# Altium footprint library General.PCBLIB: 231 footprints (part 1 of 15)
Each footprint in its own frame and in the unit in brackets; x right, y up, seen from the top. Pads: shape width x height; smd on the part's side, far side on the other; paste and mask are expansions set on the pad; w line width, h text height; cw(c..) or ccw(c..) is an arc to the next point about the centre after c.
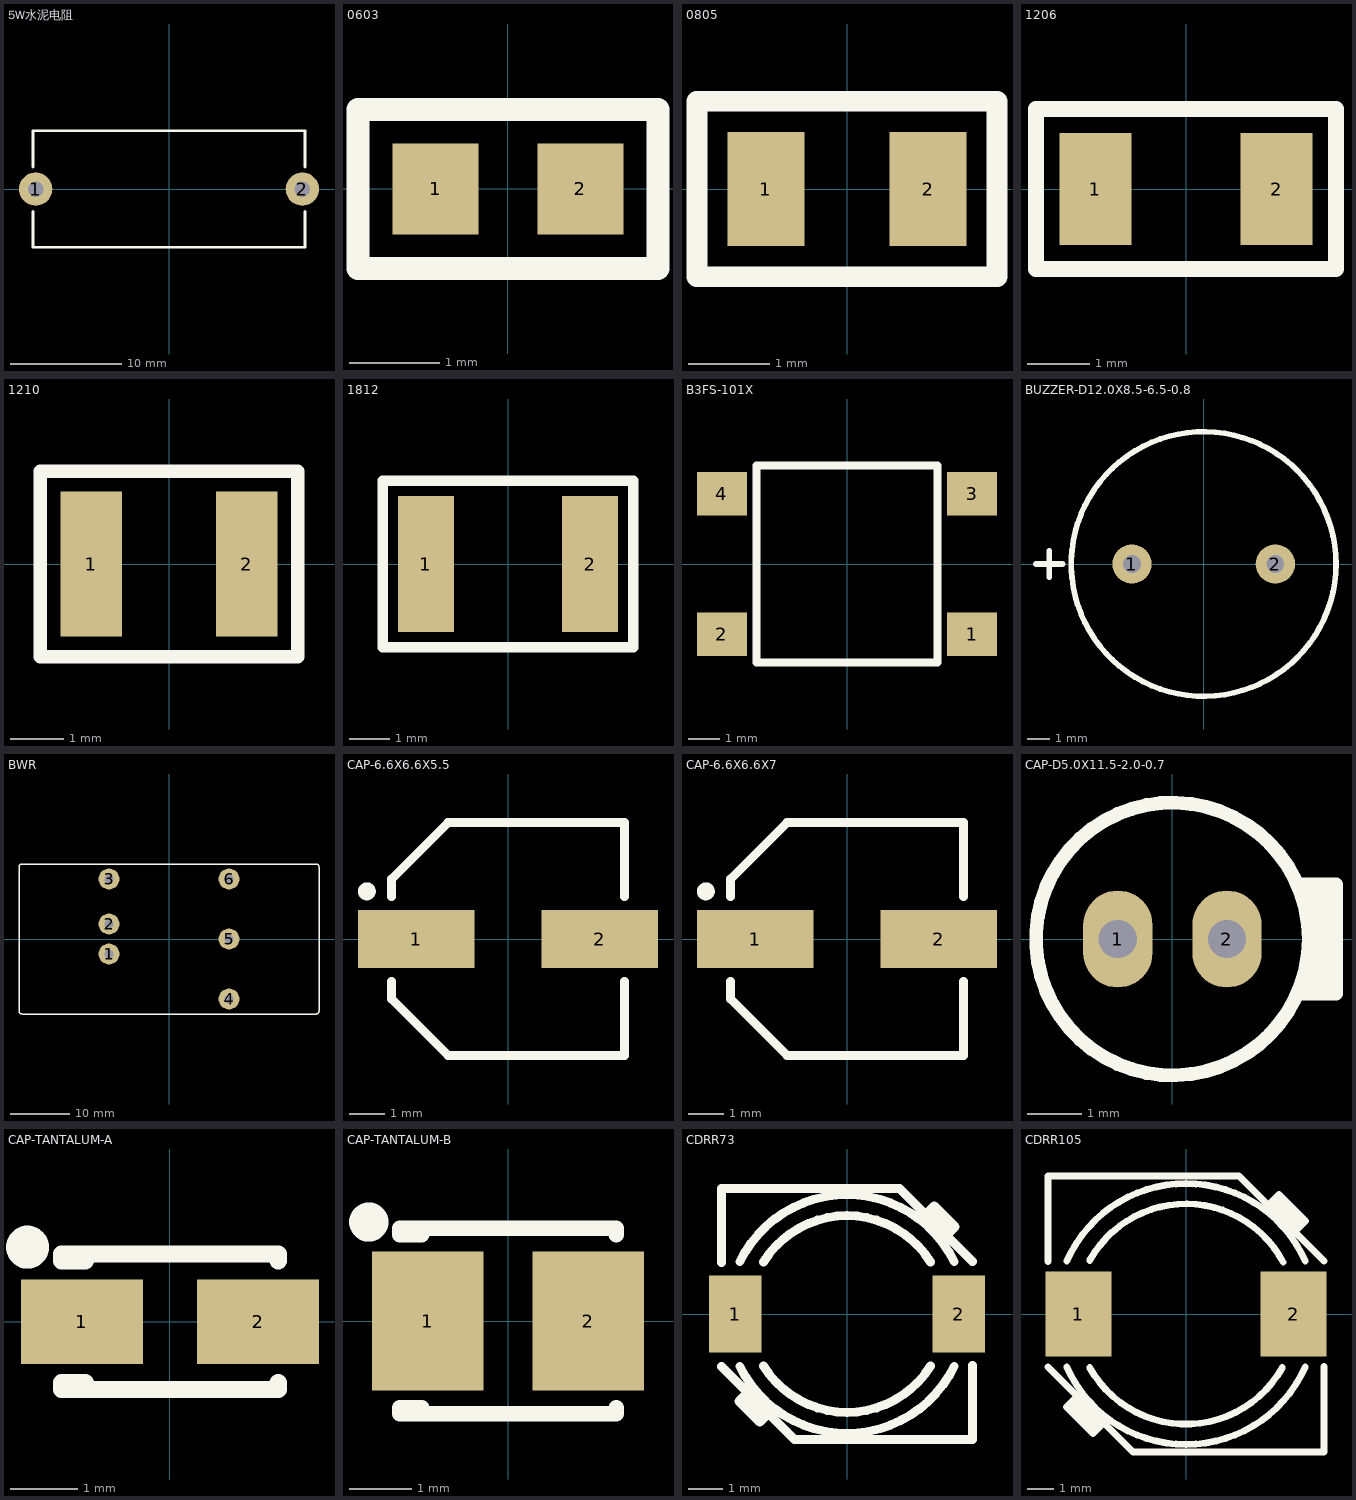
[diagram p0: the footprints below, top view; thin cyan lines are the x and y axes]

## 5W水泥电阻 [mm] "Fuse holder, 5*20mm fuse"
height 12.5
pads (2):
  round 3 hole 1.4: 1(-12,0) 2(12,0)
Top Overlay:
  lines w0.254: -12.25,-2 -12.25,-5.232 12.25,-5.232 12.25,-2 ; -12.25,2 -12.25,5.258 12.25,5.258 12.25,2
3D body "FUSE_HOLDER-MF563.STEP": height 12.5, standoff -2.81, extent -12.25,-4.75 12.25,4.75

## 0603 [mm] "SMD, 0603"
height 0.45
pads (2):
  rect 0.95x1 smd: 1(-0.8,0) 2(0.8,0)
Top Overlay:
  lines w0.254: -1.656,-0.88 -1.656,0.88 1.656,0.88 1.656,-0.88 -1.656,-0.88
3D body "RES0603.STEP": height 0.45, standoff 0, extent -0.775,-0.425 0.775,0.425

## 0805 [mm] "SMD, 0805"
height 0.55
pads (2):
  rect 0.95x1.4 smd: 1(-1,0) 2(1,0)
Top Overlay:
  lines w0.254: -1.85,-1.08 1.85,-1.08 1.85,1.08 -1.85,1.08 -1.85,-1.08
3D body "RESC0805.STEP": height 0.45, standoff 0, extent -1,-0.62 1,0.63

## 1206 [mm] "SMD, 1206"
height 0.55
pads (2):
  rect 1.15x1.8 smd: 1(-1.45,0) 2(1.45,0)
Top Overlay:
  lines w0.254: -2.4,-1.28 -2.4,1.28 2.4,1.28 2.4,-1.28 -2.4,-1.28
3D body "RES1206.STEP": height 0.55, standoff 0, extent -1.6,-0.8 1.6,0.8

## 1210 [mm] "SMD, 1210"
height 0.55
pads (2):
  rect 1.15x2.7 smd: 1(-1.45,0) 2(1.45,0)
Top Overlay:
  lines w0.254: -2.4,-1.73 2.4,-1.73 2.4,1.73 -2.4,1.73 -2.4,-1.73
3D body "RES1210.STEP": height 0.55, standoff 0, extent -1.6,-1.25 1.6,1.25

## 1812 [mm] "SMD, 1812"
height 1.6
pads (2):
  rect 1.4x3.4 smd: 1(-2.05,0) 2(2.05,0)
Top Overlay:
  lines w0.254: -3.13,-2.08 -3.13,2.08 3.13,2.08 3.13,-2.08 -3.13,-2.08
3D body "RES1812.STEP": height 1.6, standoff 0, extent -2.25,-1.6 2.25,1.6

## B3FS-101X [mm] "OMRON TACT-SWITCH"
height 4.3
pads (4):
  rect 1.6x1.4 smd: 1(4,-2.25) 2(-4,-2.25) 3(4,2.25) 4(-4,2.25)
Top Overlay:
  lines w0.254: -2.9,-3.15 -2.9,3.15 2.9,3.15 2.9,-3.15 -2.9,-3.15
3D body "B3FS-1012.stp": height 4.3, standoff 0, extent -4,-3.15 4,3.15

## BUZZER-D12.0X8.5-6.5-0.8 [mm] "Buzzer"
height 8.5
pads (2):
  round 1.778 hole 0.8: 1(-3.25,0) 2(3.25,0)
Top Overlay:
  circle w0.254: c0,0 r6
  lines w0.254: -7.6,0 -6.4,0 ; -7,-0.6 -7,0.6
3D body "BUZZER-12x8.5-6.5.step": height 8.6, standoff -5.4, extent -6,-6 6,6

## BWR [mil] "MURATA POWER"
height 480
pads (6):
  round 140 hole 59.06: 1(-400,-100) 2(-400,100) 3(-400,400) 4(400,-400) 5(400,0) 6(400,400)
Top Overlay:
  lines w10: -1000,-480 ccw(c-980,-480) -980,-500 980,-500 ccw(c980,-480) 1000,-480 1000,480 ccw(c980,480) 980,500 -980,500 ccw(c-980,480) -1000,480 -1000,-480
3D body: height 480, standoff 0, extent -1000,-500 1000,500

## CAP-6.6X6.6X5.5 [mm] "Polar Capacitors, SMD"
height 5.5
pads (2):
  rect 3.3x1.65 smd: 1(-2.6,0) 2(2.6,0)
Top Overlay:
  circle w0.254: c-4,1.35 r0.127
  lines w0.254: -3.3,-1.2 -3.3,-1.7 -1.7,-3.3 3.3,-3.3 3.3,-1.2 ; -3.3,1.2 -3.3,1.7 -1.7,3.3 3.3,3.3 3.3,1.2
3D body "CAP-6.6X6.6X5.5.STEP": height 5.4, standoff 0, extent -3.5,-3.3 3.5,3.3

## CAP-6.6X6.6X7 [mm] "Polar Capacitors, SMD"
height 7
pads (2):
  rect 3.3x1.65 smd: 1(-2.6,0) 2(2.6,0)
Top Overlay:
  circle w0.254: c-4,1.35 r0.127
  lines w0.254: -3.3,-1.2 -3.3,-1.7 -1.7,-3.3 3.3,-3.3 3.3,-1.2 ; -3.3,1.2 -3.3,1.7 -1.7,3.3 3.3,3.3 3.3,1.2
3D body "CAP-6.6X6.6X7.STEP": height 7.7, standoff 0, extent -3.5,-3.3 3.5,3.3

## CAP-D5.0X11.5-2.0-0.7 [mm] "Polar Capacitors"
height 11.5
pads (2):
  oval 1.27x1.778 hole 0.7: 1(-1,0) 2(1,0)
Top Overlay:
  circle w0.254: c0,0 r2.5
  lines w0.254: 2.291,-1 3,-1 3,1 2.291,1 ; 2.6,-1 2.6,1 ; 2.8,-1 2.8,1
3D body "CAPPR200-500X1150.step": height 11.51, standoff -2.7, extent -2.5,-2.5 2.488,2.5

## CAP-TANTALUM-A [mm] "Tantalum Capacitor Case A, SMD"
height 1.8
pads (2):
  rect 1.8x1.25 smd: 1(-1.3,0) 2(1.3,0)
Top Overlay:
  circle w0.381: c-2.1,1.1 r0.127
  lines w0.254: -1.45,-1 -1.45,-0.9 ; -1.45,0.9 -1.45,1 ; -1.25,-1 -1.25,-0.9 -1.6,-0.9 -1.6,-1 1.6,-1 1.6,-0.9 ; -1.25,1 -1.25,0.9 -1.6,0.9 -1.6,1 1.6,1 1.6,0.9
3D body "CAP-TANTALUM-A.STEP": height 1.6, standoff 0, extent -1.6,-0.8 1.6,0.8

## CAP-TANTALUM-B [mm] "Tantalum Capacitor Case B, SMD"
height 1.9
pads (2):
  rect 1.8x2.25 smd: 1(-1.3,0) 2(1.3,0)
Top Overlay:
  circle w0.381: c-2.25,1.6 r0.127
  lines w0.254: -1.6,-1.5 -1.6,-1.4 ; -1.6,1.4 -1.6,1.5 ; -1.4,-1.5 -1.4,-1.4 -1.75,-1.4 -1.75,-1.5 1.75,-1.5 1.75,-1.4 ; -1.4,1.5 -1.4,1.4 -1.75,1.4 -1.75,1.5 1.75,1.5 1.75,1.4
3D body "CAP-TANTALUM-B.STEP": height 1.9, standoff 0, extent -1.75,-1.4 1.75,1.4

## CDRR73 [mm] "SUMIDA, Inductor, SMD, CDRR73"
height 4.5
pads (2):
  rect 1.5x2.2 smd: 1(-3.2,0) 2(3.2,0)
Top Overlay:
  lines w0.254: -3.6,-1.5 -1.5,-3.6 3.6,-3.6 3.6,-1.48 ; -3.6,1.48 -3.6,3.6 1.5,3.6 3.6,1.5 ; -3.074,-1.499 ccw(c0,0) 3.074,-1.499 ; -3.074,1.499 cw(c0,0) 3.074,1.499 ; -3,-2.4 -2.4,-3 ; -2.8,-2.2 -3.1,-2.5 -2.5,-3.1 -2.2,-2.8 ; -2.391,-1.494 ccw(c0,0) 2.391,-1.494 ; -2.391,1.494 cw(c0,0) 2.391,1.494 ; 2.2,2.8 2.5,3.1 3.1,2.5 2.8,2.2 ; 2.4,3 3,2.4
3D body "SUMIDA-CDRR75.STEP": height 4.5, standoff -0.03, extent -3.525,-3.5 3.525,3.5

## CDRR105 [mm] "SUMIDA, Inductor, SMD, CDRR105"
height 4.5
pads (2):
  rect 2.5x3.2 smd: 1(-4.05,0) 2(4.05,0)
Top Overlay:
  lines w0.254: -5.2,-2 -2,-5.2 5.2,-5.2 5.2,-1.98 ; -5.2,1.98 -5.2,5.2 2,5.2 5.2,2 ; -4.49,-1.999 ccw(c0,0) 4.49,-1.999 ; -4.49,1.999 cw(c0,0) 4.49,1.999 ; -4.4,-3.4 -3.4,-4.4 ; -4.3,-3.3 -3.3,-4.3 ; -4.2,-3.2 -3.2,-4.2 ; -4,-3 -4.5,-3.5 -3.5,-4.5 -3,-4 ; -3.63,-2.012 ccw(c0,0) 3.63,-2.012 ; -3.63,2.012 cw(c0,0) 3.664,1.948 ; 3,4 3.5,4.5 4.5,3.5 4,3 ; 3.2,4.2 4.2,3.2 ; 3.3,4.3 4.3,3.3 ; 3.4,4.4 4.4,3.4
3D body "SUMIDA-CDRR105.STEP": height 4.5, standoff -0.03, extent -5.025,-5 5.025,5